# Altium footprint library std-th.PcbLib: 245 footprints (part 13 of 16)
Each footprint in its own frame and in the unit in brackets; x right, y up, seen from the top. Pads: shape width x height; smd on the part's side, far side on the other; paste and mask are expansions set on the pad; w line width, h text height; cw(c..) or ccw(c..) is an arc to the next point about the centre after c.
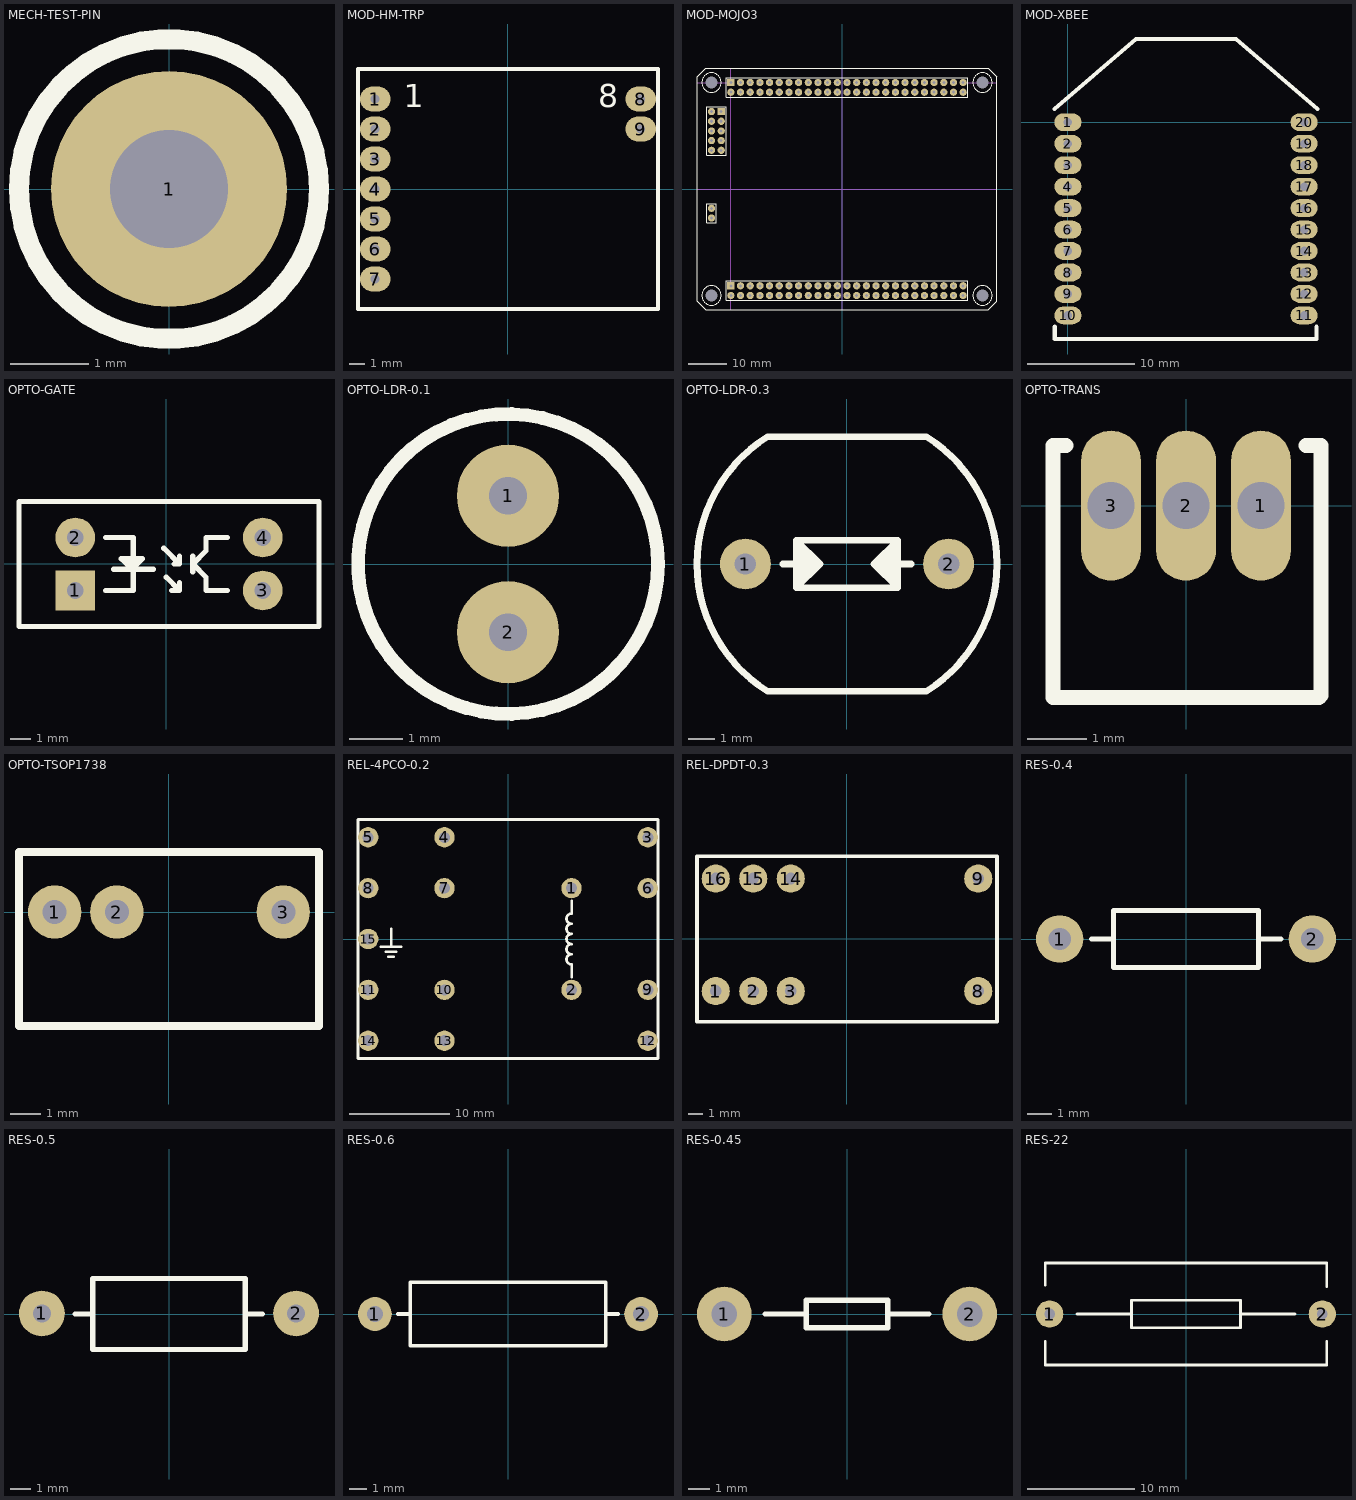
[diagram p12: the footprints below, top view; thin cyan lines are the x and y axes]

## MECH-TEST-PIN [mm]
pads (1):
  round 3 hole 1.5: 1(0,0)
Top Overlay:
  circle w0.254: c0,0 r1.905
3D body: height 7.5, standoff -6.1, extent -1.141,-1.148 1.15,1.148

## MOD-HM-TRP [mm] "Hope RF HM-TRP 433 MHz transceiver module"
height 10
pads (9):
  oval 2.032x1.651 hole 0.6: 1(-8.85,6) 2(-8.85,4) 3(-8.85,2) 4(-8.85,0) 5(-8.85,-2) 6(-8.85,-4) 7(-8.85,-6) 8(8.85,6) 9(8.85,4)
Top Overlay:
  lines w0.254: -10,-8 10,-8 10,8 -10,8 -10,-8
  text "1" at -6.952,5.46 h1.52
  text "8" at 6.002,5.46 h1.52
3D body: height 7.23, standoff -1.96, extent -10,-8 10,8

## MOD-MOJO3 [mm] "Mojo v3 Board"
height 15
pads (116):
  round 0 hole 3.2 unplated: 0(-34.29,-27.94) 0(-34.29,27.94) 0(36.83,-27.94) 0(36.83,27.94)
  rect 1.905x1.905 hole 0.8 unplated: 1(-29.21,27.94) 51(-29.21,-25.4) 102(-31.75,20.32)
  round 1.905 hole 0.8 unplated: 2(-29.21,25.4) 3(-26.67,27.94) 4(-26.67,25.4) 5(-24.13,27.94) 6(-24.13,25.4) 7(-21.59,27.94) 8(-21.59,25.4) 9(-19.05,27.94) 10(-19.05,25.4) 11(-16.51,27.94) 12(-16.51,25.4) 13(-13.97,27.94) 14(-13.97,25.4) 15(-11.43,27.94) 16(-11.43,25.4) 17(-8.89,27.94) 18(-8.89,25.4) 19(-6.35,27.94) 20(-6.35,25.4) 21(-3.81,27.94) 22(-3.81,25.4) 23(-1.27,27.94) 24(-1.27,25.4) 25(1.27,27.94) 26(1.27,25.4) 27(3.81,27.94) 28(3.81,25.4) 29(6.35,27.94) 30(6.35,25.4) 31(8.89,27.94) 32(8.89,25.4) 33(11.43,27.94) 34(11.43,25.4) 35(13.97,27.94) 36(13.97,25.4) 37(16.51,27.94) 38(16.51,25.4) 39(19.05,27.94) 40(19.05,25.4) 41(21.59,27.94) 42(21.59,25.4) 43(24.13,27.94) 44(24.13,25.4) 45(26.67,27.94) 46(26.67,25.4) 47(29.21,27.94) 48(29.21,25.4) 49(31.75,27.94) 50(31.75,25.4) 52(-29.21,-27.94) 53(-26.67,-25.4) 54(-26.67,-27.94) 55(-24.13,-25.4) 56(-24.13,-27.94) 57(-21.59,-25.4) 58(-21.59,-27.94) 59(-19.05,-25.4) 60(-19.05,-27.94) 61(-16.51,-25.4) 62(-16.51,-27.94) 63(-13.97,-25.4) 64(-13.97,-27.94) 65(-11.43,-25.4) 66(-11.43,-27.94) 67(-8.89,-25.4) 68(-8.89,-27.94) 69(-6.35,-25.4) 70(-6.35,-27.94) 71(-3.81,-25.4) 72(-3.81,-27.94) 73(-1.27,-25.4) 74(-1.27,-27.94) 75(1.27,-25.4) 76(1.27,-27.94) 77(3.81,-25.4) 78(3.81,-27.94) 79(6.35,-25.4) 80(6.35,-27.94) 81(8.89,-25.4) 82(8.89,-27.94) 83(11.43,-25.4) 84(11.43,-27.94) 85(13.97,-25.4) 86(13.97,-27.94) 87(16.51,-25.4) 88(16.51,-27.94) 89(19.05,-25.4) 90(19.05,-27.94) 91(21.59,-25.4) 92(21.59,-27.94) 93(24.13,-25.4) 94(24.13,-27.94) 95(26.67,-25.4) 96(26.67,-27.94) 97(29.21,-25.4) 98(29.21,-27.94) 99(31.75,-25.4) 100(31.75,-27.94) 101(-34.29,20.32) 103(-34.29,17.78) 104(-31.75,17.78) 105(-34.29,15.24) 106(-31.75,15.24) 107(-34.29,12.7) 108(-31.75,12.7) 109(-34.29,10.16) 110(-31.75,10.16) 111(-34.29,-5.08) 112(-34.29,-7.62)
Top Overlay:
  circle w0.254: c-34.29,-27.94 r2.54
  circle w0.254: c36.83,-27.94 r2.54
  circle w0.254: c36.83,27.94 r2.54
  circle w0.254: c-34.29,27.94 r2.54
  lines w0.254: -38.1,-29.515 -35.865,-31.75 ; -38.1,-29.515 -35.865,-31.75 ; -38.1,-29.515 -38.1,29.515 ; -38.1,29.515 -35.865,31.75 ; -38.1,29.515 -35.865,31.75 ; -35.865,-31.75 38.405,-31.75 ; -35.865,31.75 38.405,31.75 ; 38.405,-31.75 40.64,-29.515 ; 38.405,-31.75 40.64,-29.515 ; 38.405,31.75 40.64,29.515 ; 38.405,31.75 40.64,29.515 ; 40.64,-29.515 40.64,29.515 ; -35.56,-8.89 -35.56,-3.81 -33.02,-3.81 -33.02,-8.89 -35.56,-8.89 ; -35.56,8.89 -35.56,21.59 -30.48,21.59 -30.48,8.89 -35.56,8.89 ; -30.48,-29.21 -30.48,-24.13 33.02,-24.13 33.02,-29.21 -30.48,-29.21 ; -30.48,24.13 -30.48,29.21 33.02,29.21 33.02,24.13 -30.48,24.13
Mechanical 1:
  lines w0.254: -38.1,0 40.64,0 ; -38.1,27.94 -29.21,27.94 -29.21,31.75 ; -29.21,-31.75 -29.21,-27.94 ; -29.21,-25.4 -29.21,25.4 ; 0,-31.75 0,31.75 ; 31.75,27.94 40.64,27.94
3D body: height 8.54, standoff -3, extent -30.48,-26.67 -10.16,-24.13
3D body: height 8.54, standoff -3, extent -30.48,-29.21 -10.16,-26.67
3D body: height 8.54, standoff -3, extent -10.16,-26.67 10.16,-24.13
3D body: height 8.54, standoff -3, extent -10.16,-29.21 10.16,-26.67
3D body: height 8.54, standoff -3, extent 10.16,-26.67 30.48,-24.13
3D body: height 8.54, standoff -3, extent 10.16,-29.21 30.48,-26.67
3D body: height 8.54, standoff -3, extent 12.7,-26.67 33.02,-24.13
3D body: height 8.54, standoff -3, extent 12.7,-29.21 33.02,-26.67
3D body: height 8.54, standoff -3, extent -30.48,24.13 -10.16,26.67
3D body: height 8.54, standoff -3, extent -30.48,26.67 -10.16,29.21
3D body: height 8.54, standoff -3, extent -10.16,26.67 10.16,29.21
3D body: height 8.54, standoff -3, extent -10.16,24.13 10.16,26.67
3D body: height 8.54, standoff -3, extent 10.16,26.67 30.48,29.21
3D body: height 8.54, standoff -3, extent 10.16,24.13 30.48,26.67
3D body: height 8.54, standoff -3, extent 12.7,26.67 33.02,29.21
3D body: height 8.54, standoff -3, extent 12.7,24.13 33.02,26.67
3D body: height 8.44, standoff -2.54, extent -35.56,19.05 -30.48,21.59
3D body: height 8.44, standoff -2.54, extent -35.56,16.51 -30.48,19.05
3D body: height 8.44, standoff -2.54, extent -35.56,13.97 -30.48,16.51
3D body: height 8.44, standoff -2.54, extent -35.56,11.43 -30.48,13.97
3D body: height 8.44, standoff -2.54, extent -35.56,8.89 -30.48,11.43
3D body: height 8.44, standoff -2.54, extent -35.56,-8.89 -33.02,-3.81

## MOD-XBEE [mm] "XBee"
height 8
pads (20):
  oval 2.54x1.651 hole 0.8: 1(0,0) 2(0,-2) 3(0,-4) 4(0,-6) 5(0,-8) 6(0,-10) 7(0,-12) 8(0,-14) 9(0,-16) 10(0,-18) 11(22,-18) 12(22,-16) 13(22,-14) 14(22,-12) 15(22,-10) 16(22,-8) 17(22,-6) 18(22,-4) 19(22,-2) 20(22,0)
Top Overlay:
  lines w0.381: -1.25,1.22 6.35,7.75 15.65,7.75 23.25,1.22 ; -1.221,-19.05 -1.221,-20.193 23.159,-20.193 23.159,-19.05
3D body: height 6.5, standoff -1, extent -1.25,-20.15 23.25,7.75

## OPTO-GATE [mm] "Light Gate"
height 10
pads (4):
  rect 1.905x1.905 hole 0.8: 1(-4.373,-1.27)
  round 1.905 hole 0.8: 2(-4.373,1.27) 3(4.627,-1.27) 4(4.627,1.27)
Top Overlay:
  lines w0.254: -2.921,1.27 -1.587,1.27 -1.587,-0.254 ; -2.54,-0.254 -0.635,-0.254 ; -1.778,0.127 -1.524,0.127 -1.524,-0.127 -1.651,0 -1.651,0.127 ; -0.127,0.762 0.635,0 ; 0,-0.635 0.635,-1.27 ; 0.254,-1.27 0.635,-1.27 ; 0.381,0 0.635,0 ; 0.635,-0.889 0.635,-1.27 ; 0.635,0.381 0.635,0 ; 1.27,-0.381 1.27,0.381 ; 2.921,1.27 1.905,1.27 1.905,0.635 1.27,0 1.905,-0.635 1.905,-1.27 2.921,-1.27 ; -2.921,-1.27 -1.587,-1.27 -1.587,-0.254 ; -2.921,-1.27 -2.921,-1.27 ; -1.587,-0.254 -1.651,-0.254 -2.159,0.254 -1.143,0.254 -1.587,-0.191 -1.587,-0.254 ; 2.921,-1.27 2.921,-1.27 ; -7.073,-3 7.327,-3 7.327,3 -7.073,3 -7.073,-3
3D body: height 10.2, standoff -5, extent -7.073,-3 7.327,3

## OPTO-LDR-0.1 [mm] "LDR, 100 mil pitch"
pads (2):
  round 1.905 hole 0.7: 1(0,1.27) 2(0,-1.27)
Top Overlay:
  circle w0.254: c0,0 r2.794
3D body: height 2.24, standoff -2.5, extent -2.15,-2.604 2.15,2.606

## OPTO-LDR-0.3 [mm] "Light Dependent Resistor, 300 mil pitch"
height 2
pads (2):
  round 1.905 hole 0.8: 1(-3.81,0) 2(3.81,0)
Top Overlay:
  region: -1.905,0.889 -1.016,0 -1.905,-0.889
  region: 1.905,-0.889 1.016,0 1.905,0.889
  lines w0.254: -2.413,0 -1.905,0 ; 1.905,0 2.413,0 ; -1.905,-0.889 1.905,-0.889 ; -1.905,-0.889 -1.905,0.889 ; -1.905,-0.889 -1.016,0 -1.905,0.889 ; -1.905,0.889 1.905,0.889 ; 1.905,-0.889 1.905,0.889 ; 1.905,-0.889 1.016,0 1.905,0.889 ; -2.973,-4.775 cw(c0,0) -2.973,4.775 2.973,4.775 cw(c0,0) 2.973,-4.775 -2.973,-4.775
3D body: height 2.38, standoff -36.5, extent -5.625,-4.775 5.625,4.775

## OPTO-TRANS [mil] "Phototransistor, 3 leads, 50 mil pitch"
height 314.96
pads (3):
  oval 40x100 hole 31.5: 1(50,0) 2(0,0) 3(-50,0)
Top Overlay:
  lines w10: -79.99,40 -88.57,40 -88.57,-127.94 88.59,-127.94 90.01,-126.53 90.01,40 80.01,40
3D body: height 366.14, standoff -78.74, extent -88.57,-127.94 88.59,47.25

## OPTO-TSOP1738 [mil] "Infrared sensor, digital, TSOP"
height 590.55
pads (3):
  round 70 hole 31.5: 1(-150,0) 2(-68.39,0) 3(150,0)
Top Overlay:
  lines w10: -196.84,-149.6 -196.84,78.75 196.86,78.75 196.86,-149.6 -196.84,-149.6
3D body: height 492.13, standoff -712.6, extent -196.84,-149.6 196.86,78.75

## REL-4PCO-0.2 [mil] "Relay, 4PCO, 14 leads, switch pitch 200 mil, switch coil pitch 400 mil, row pitch 200 mil"
height 425
pads (15):
  round 80 hole 43.31: 1(250,200) 2(250,-200) 3(550,400) 4(-250,400) 5(-550,400) 6(550,200) 7(-250,200) 8(-550,200) 9(550,-200) 10(-250,-200) 11(-550,-200) 12(550,-400) 13(-250,-400) 14(-550,-400) 15(-550,0)
Top Overlay:
  lines w10: -500,-30 -420,-30 ; -480,-50 -440,-50 ; -470,-70 -450,-70 ; -460,-30 -460,40 ; 250,-150 250,-100 cw(c250,-80) 250,-60 cw(c250,-40) 250,-20 cw(c250,0) 250,20 cw(c250,40) 250,60 cw(c250,80) 250,100 250,150 ; -590,-470 590,-470 590,470 -590,470 -590,-470
3D body: height 401.97, standoff -133.86, extent -586.61,-467.71 586.62,467.72

## REL-DPDT-0.3 [mm] "Relay, DPDT, 8 leads, switch pitch 100 mil, switch coil pitch 400 mil, row pitch 200 mil"
height 12.7
pads (8):
  round 1.905 hole 0.8: 1(-8.89,-3.556) 2(-6.35,-3.556) 3(-3.81,-3.556) 8(8.89,-3.556) 9(8.89,4.064) 14(-3.81,4.064) 15(-6.35,4.064) 16(-8.89,4.064)
Top Overlay:
  lines w0.254: -10.16,-5.638 10.16,-5.638 10.16,5.588 -10.16,5.588 -10.16,-5.638
3D body: height 15.24, standoff -4, extent -10.16,-5.638 10.16,5.588

## RES-0.4 [mm] "Axial Resistor Thru-Hole; 2 Leads; 0.4 in Pin Spacing"
height 1.524
pads (2):
  round 1.905 hole 0.9: 1(-5.08,0) 2(5.08,0)
Top Overlay:
  lines w0.2: -3.81,0 -2.921,0 ; 2.921,-1.143 -2.921,-1.143 -2.921,1.143 2.921,1.143
  lines w0.203: 2.921,-1.143 2.921,1.143 ; 2.921,0 3.81,0
3D body: height 2.93, standoff -2.54, extent -5.385,-1.156 5.385,1.156

## RES-0.5 [mil] "Weerstand, 1/2 W, 500 mil pitch"
height 196.85
pads (2):
  round 90 hole 35.43: 1(-250.01,1.09) 2(249.99,1.09)
Top Overlay:
  lines w10: -185,0 -150,0 ; 150,0 183.91,0 ; -150,-70 150,-70 150,70 -150,70 -150,-70
3D body: height 137.8, standoff -118.11, extent -260.63,-67.8 260.63,70

## RES-0.6 [mm] "Axial Resistor Thru-Hole; 2 Leads; 0.6 in Pin Spacing"
height 1.524
pads (2):
  round 1.905 hole 0.9: 1(-7.5,0) 2(7.5,0)
Top Overlay:
  lines w0.2: -6.223,0 -5.5,0 ; -5.5,-1.8 5.5,-1.8 5.5,1.8 -5.5,1.8 -5.5,-1.8
  lines w0.203: 5.5,0 6.223,0
3D body: height 4.75, standoff -2, extent -7.85,-2.25 7.85,2.25

## RES-0.45 [mm] "Resistor, high current, 450 mil pitch"
height 5.08
pads (2):
  round 2.54 hole 1.2: 1(-5.715,0) 2(5.715,0)
Top Overlay:
  lines w0.254: -3.81,0 -1.905,0 ; 3.81,0 1.905,0 ; 1.905,0 1.905,0.635 -1.905,0.635 -1.905,-0.635 1.905,-0.635 1.905,0
3D body: height 6.5, standoff -2, extent -6.6,-1.2 6.6,1.2

## RES-22 [mm] "Resistor, 22 mm x 10 mm body, 1000 mil pitch, 5 W"
height 10
pads (2):
  round 2.54 hole 1: 1(-12.7,0) 2(12.7,0)
Top Overlay:
  lines w0.254: -13.1,-2.54 -13.1,-4.75 13.1,-4.75 13.1,-2.54 ; -13.1,2.686 -13.1,4.75 13.1,4.75 13.1,2.54 ; -10.16,0 -5.08,0 ; 5.08,0 10.16,0 ; -5.08,-1.27 5.08,-1.27 5.08,1.27 -5.08,1.27 -5.08,-1.27
3D body: height 9, standoff -5.44, extent -13.1,-4.75 13.1,4.75